# Altium schematic symbol library Analog Devices Data Converters Digital-to-Analog Converters.SchLib: 2231 symbols (part 90 of 135)
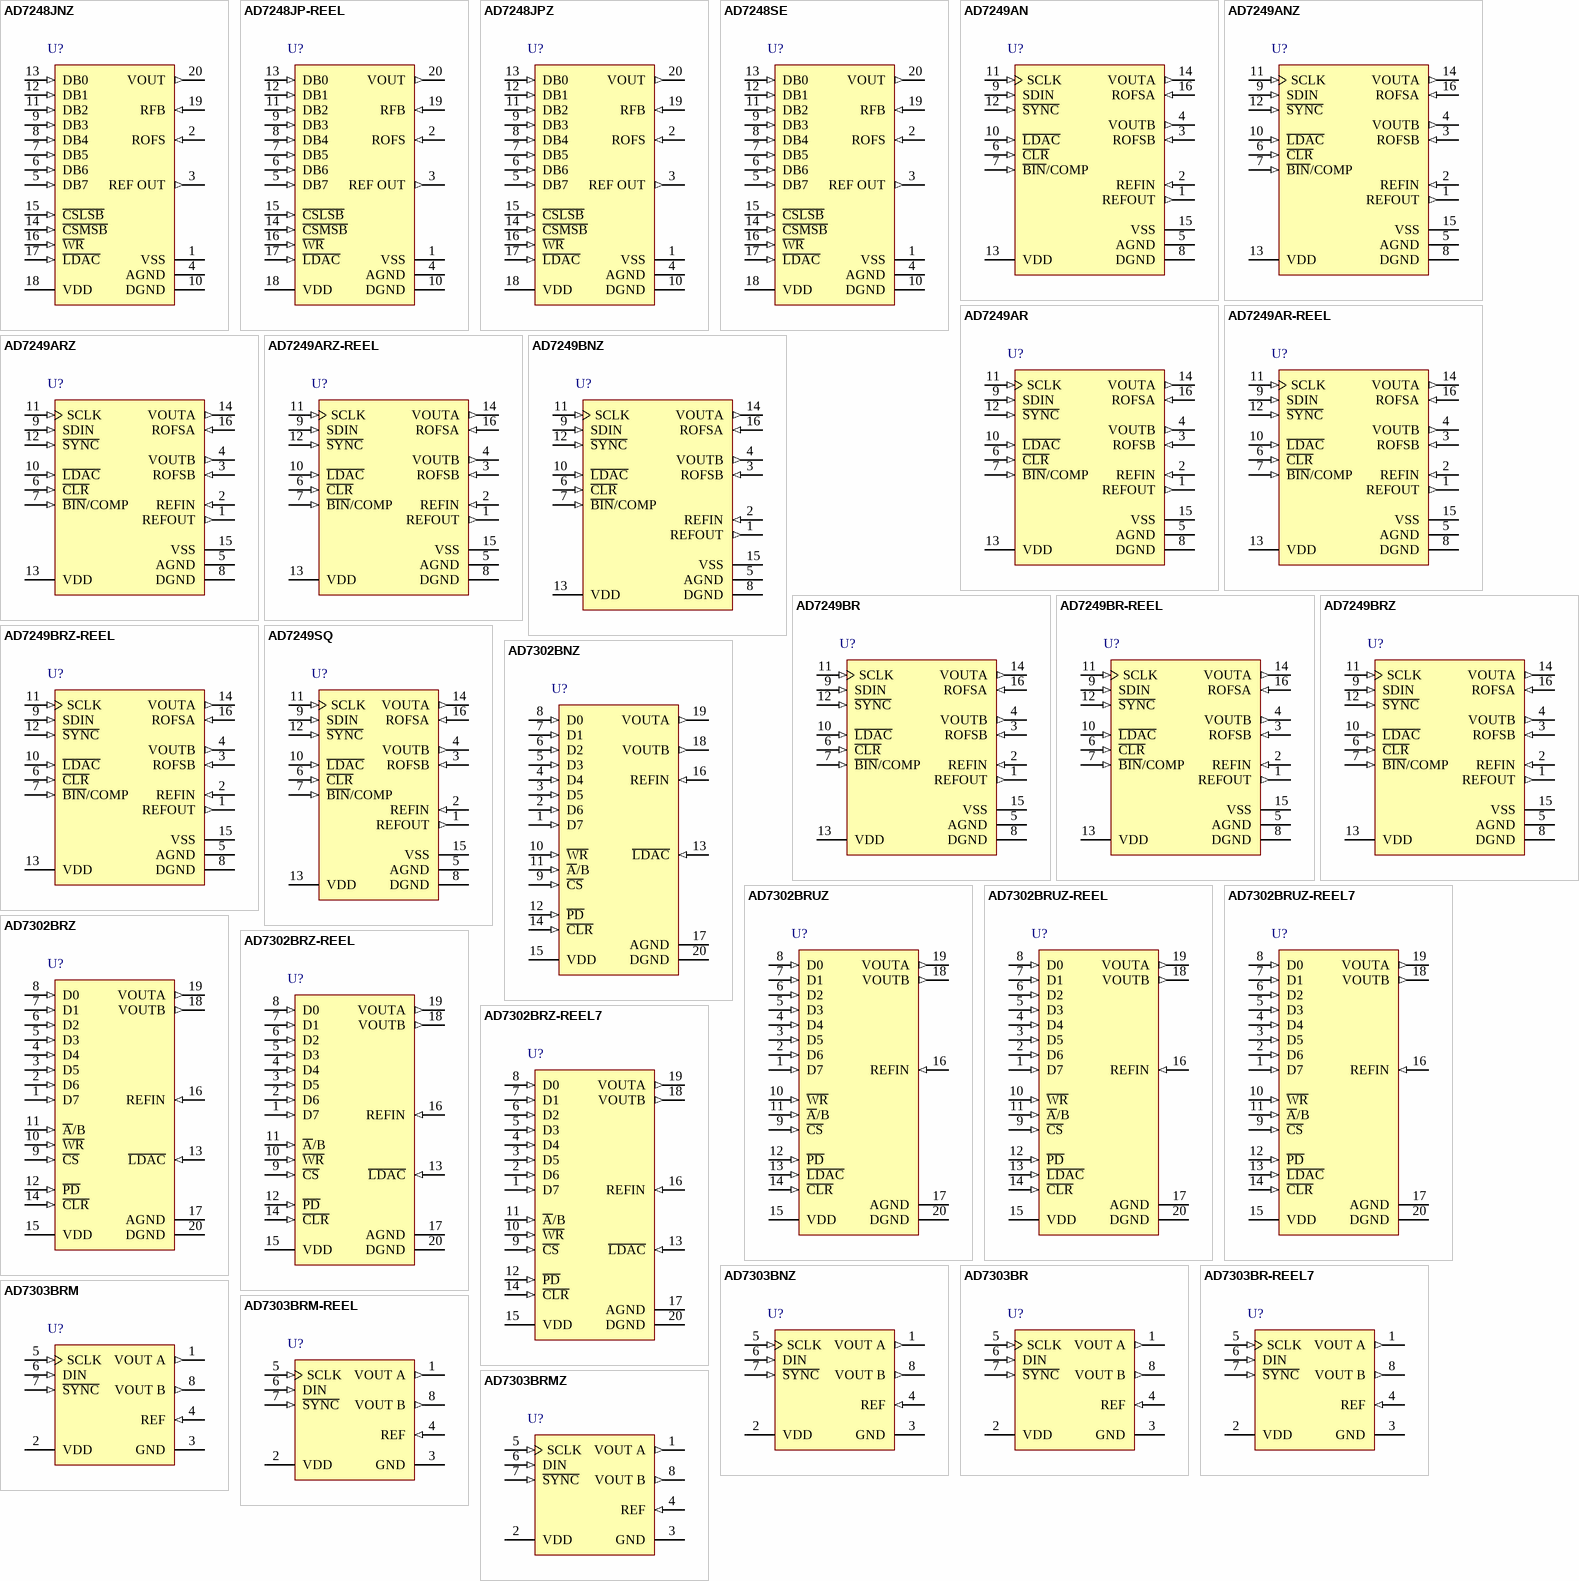
[diagram p202: symbols AD7248JNZ to AD7303BRMZ]

## AD7302BRZ-REEL
designator U?
Dual 8-Bit Voltage Output Digital-to-Analog Converter with Parallel Interface, 2.7 to 5.5 V, 0 to 70 degC, RW-20, Pb-Free, Reel; Generic Part Number: AD7302; Manufacturer: Analog Devices; PartNumber: AD7302BRZ-REEL; # DAC Outputs: 2; Max V+: 5.5V; Op Pwr Diss: 24.8mW; Resolution (Bits): 8; Settling Time: 1.2µs; Single Supply: Yes; DatasheetVersion: Rev.0; PackageVersion: 060706-A; PackageReference: RW-20; PackageDescription: 20-Lead Standard Small Outline Package [SOIC_W] Wide Body; Supplier 1: Digi-Key; Supplier Part Number 1: AD7302BRZ-REEL-ND; Supplier 2: Mouser; Supplier Part Number 2: 584-AD7302BRZ-R; Packing: Reel; RoHS: Y; Mounting Technology: Surface Mount; Code_JEDEC: MS-013-AC; ComponentLink1Description: Manufacturer URL; ComponentLink1URL: http://www.analog.com/en/index.html; ComponentLink2Description: Datasheet; ComponentLink2URL: http://www.analog.com/static/imported-files/data_sheets/AD7302.pdf; ComponentLink3Description: Package Specification; ComponentLink3URL: http://www.analog.com/static/imported-files/packages/233848RW_20.pdf; ComponentLink4Description: Product URL; ComponentLink4URL: http://www.analog.com/en/digital-to-analog-converters/da-converters/ad7302/products/product.html
footprint RW-20_N (SOIC, 20-Leads, Body 12.8x7.5mm, Pitch 1.27mm, IPC Medium Density)
footprint RW-20_L (SOIC, 20-Leads, Body 12.8x7.5mm, Pitch 1.27mm, IPC High Density)
footprint RW-20_M (SOIC, 20-Leads, Body 12.8x7.5mm, Pitch 1.27mm, IPC Low Density)
pins: 1 D7 (in) "Parallel Data Inputs. Eight-bit data is loaded to the input register of the AD7302 under the control of C\S\ and W\R\.", 2 D6 (in) "Parallel Data Inputs. Eight-bit data is loaded to the input register of the AD7302 under the control of C\S\ and W\R\.", 3 D5 (in) "Parallel Data Inputs. Eight-bit data is loaded to the input register of the AD7302 under the control of C\S\ and W\R\.", 4 D4 (in) "Parallel Data Inputs. Eight-bit data is loaded to the input register of the AD7302 under the control of C\S\ and W\R\.", 5 D3 (in) "Parallel Data Inputs. Eight-bit data is loaded to the input register of the AD7302 under the control of C\S\ and W\R\.", 6 D2 (in) "Parallel Data Inputs. Eight-bit data is loaded to the input register of the AD7302 under the control of C\S\ and W\R\.", 7 D1 (in) "Parallel Data Inputs. Eight-bit data is loaded to the input register of the AD7302 under the control of C\S\ and W\R\.", 8 D0 (in) "Parallel Data Inputs. Eight-bit data is loaded to the input register of the AD7302 under the control of C\S\ and W\R\.", 9 ~{CS} (in) "Chip Select. Active low logic input.", 10 ~{WR} (in) "Write Input. W\R\ is an active low logic input used in conjunction with C\S\ and A\/B to write data to the selected DAC register.", 11 ~{A}/B (in) "DAC Select. Address pin used to select writing to either DAC A or DAC B.", 12 ~{PD} (in) "Active low input used to put the part into low power mode reducing current consumption to less than 1 µA.", 13 ~{LDAC} (in) "Load DAC Logic Input. When this logic input is taken low both DAC outputs are simultaneously updated with the contents of their DAC registers. If L\D\A\C\ is permanently tied low, the DACs are updated on the rising edge of (See Datasheet)", 14 ~{CLR} (in) "Asynchronous Clear Input (Active Low). When this input is taken low the DAC registers are loaded with all zeroes and the DAC outputs are cleared to zero volts.", 15 VDD (power) "Power Supply Input. These parts can be operated from 2.7 V to 5.5 V and should be decoupled to AGND.", 16 REFIN (in) "External Reference Input. This can used as the reference for both DACs. The range on this reference input is 1 V to VDD/2. If REFIN is directly tied to VDD the internal VDD/2 reference is selected.", 17 AGND (power) "Analog Ground reference point and return point for all analog current on the part.", 18 VOUTB (out) "Analog output voltage from DAC B. The output amplifier can swing rail to rail on its output.", 19 VOUTA (out) "Analog output voltage from DAC A. The output amplifier can swing rail to rail on its output.", 20 DGND (power) "Digital Ground reference point and return point for all digital current on the part."

## AD7302BRZ-REEL7
designator U?
Dual 8-Bit Voltage Output Digital-to-Analog Converter with Parallel Interface, 2.7 to 5.5 V, 0 to 70 degC, RW-20, Pb-Free, Reel; Generic Part Number: AD7302; Manufacturer: Analog Devices; PartNumber: AD7302BRZ-REEL7; # DAC Outputs: 2; Max V+: 5.5V; Op Pwr Diss: 24.8mW; Resolution (Bits): 8; Settling Time: 1.2µs; Single Supply: Yes; DatasheetVersion: Rev.0; PackageVersion: 060706-A; PackageReference: RW-20; PackageDescription: 20-Lead Standard Small Outline Package [SOIC_W] Wide Body; Supplier 1: Digi-Key; Supplier Part Number 1: AD7302BRZ-REEL7TR-ND; Supplier 2: Digi-Key; Supplier Part Number 2: AD7302BRZ-REEL7CT-ND; Supplier 3: Digi-Key; Supplier Part Number 3: AD7302BRZ-REEL7DKR-ND; Supplier 4: Mouser; Supplier Part Number 4: 584-AD7302BRZ-R7; Packing: Reel; RoHS: Y; Mounting Technology: Surface Mount; Code_JEDEC: MS-013-AC; ComponentLink1Description: Manufacturer URL; ComponentLink1URL: http://www.analog.com/en/index.html; ComponentLink2Description: Datasheet; ComponentLink2URL: http://www.analog.com/static/imported-files/data_sheets/AD7302.pdf; ComponentLink3Description: Package Specification; ComponentLink3URL: http://www.analog.com/static/imported-files/packages/233848RW_20.pdf; ComponentLink4Description: Product URL; ComponentLink4URL: http://www.analog.com/en/digital-to-analog-converters/da-converters/ad7302/products/product.html
footprint RW-20_N (SOIC, 20-Leads, Body 12.8x7.5mm, Pitch 1.27mm, IPC Medium Density)
footprint RW-20_L (SOIC, 20-Leads, Body 12.8x7.5mm, Pitch 1.27mm, IPC High Density)
footprint RW-20_M (SOIC, 20-Leads, Body 12.8x7.5mm, Pitch 1.27mm, IPC Low Density)
pins: 1 D7 (in) "Parallel Data Inputs. Eight-bit data is loaded to the input register of the AD7302 under the control of C\S\ and W\R\.", 2 D6 (in) "Parallel Data Inputs. Eight-bit data is loaded to the input register of the AD7302 under the control of C\S\ and W\R\.", 3 D5 (in) "Parallel Data Inputs. Eight-bit data is loaded to the input register of the AD7302 under the control of C\S\ and W\R\.", 4 D4 (in) "Parallel Data Inputs. Eight-bit data is loaded to the input register of the AD7302 under the control of C\S\ and W\R\.", 5 D3 (in) "Parallel Data Inputs. Eight-bit data is loaded to the input register of the AD7302 under the control of C\S\ and W\R\.", 6 D2 (in) "Parallel Data Inputs. Eight-bit data is loaded to the input register of the AD7302 under the control of C\S\ and W\R\.", 7 D1 (in) "Parallel Data Inputs. Eight-bit data is loaded to the input register of the AD7302 under the control of C\S\ and W\R\.", 8 D0 (in) "Parallel Data Inputs. Eight-bit data is loaded to the input register of the AD7302 under the control of C\S\ and W\R\.", 9 ~{CS} (in) "Chip Select. Active low logic input.", 10 ~{WR} (in) "Write Input. W\R\ is an active low logic input used in conjunction with C\S\ and A\/B to write data to the selected DAC register.", 11 ~{A}/B (in) "DAC Select. Address pin used to select writing to either DAC A or DAC B.", 12 ~{PD} (in) "Active low input used to put the part into low power mode reducing current consumption to less than 1 µA.", 13 ~{LDAC} (in) "Load DAC Logic Input. When this logic input is taken low both DAC outputs are simultaneously updated with the contents of their DAC registers. If L\D\A\C\ is permanently tied low, the DACs are updated on the rising edge of (See Datasheet)", 14 ~{CLR} (in) "Asynchronous Clear Input (Active Low). When this input is taken low the DAC registers are loaded with all zeroes and the DAC outputs are cleared to zero volts.", 15 VDD (power) "Power Supply Input. These parts can be operated from 2.7 V to 5.5 V and should be decoupled to AGND.", 16 REFIN (in) "External Reference Input. This can used as the reference for both DACs. The range on this reference input is 1 V to VDD/2. If REFIN is directly tied to VDD the internal VDD/2 reference is selected.", 17 AGND (power) "Analog Ground reference point and return point for all analog current on the part.", 18 VOUTB (out) "Analog output voltage from DAC B. The output amplifier can swing rail to rail on its output.", 19 VOUTA (out) "Analog output voltage from DAC A. The output amplifier can swing rail to rail on its output.", 20 DGND (power) "Digital Ground reference point and return point for all digital current on the part."

## AD7303BNZ
designator U?
Dual 8-Bit Voltage Output Digital-to-Analog Converter with Serial Interface, 2.7 to 5.5 V, 0 to +70 degC, N-8, Pb-Free, Tube; Generic Part Number: AD7303; Manufacturer: Analog Devices; PartNumber: AD7303BNZ; # DAC Outputs: 2; Max V+: 5.5V; Op Pwr Diss: 6.93mW; Resolution (Bits): 8; Settling Time: 1.2µs; Single Supply: Yes; DatasheetVersion: Rev.0; PackageVersion: 070606-A; PackageReference: N-8; PackageDescription: 8-Lead Plastic Dual In-Line Package [PDIP] Narrow Body; Supplier 1: Digi-Key; Supplier Part Number 1: AD7303BNZ-ND; Supplier 2: Farnell; Supplier Part Number 2: 1079413; Supplier 3: Newark; Supplier Part Number 3: 31M4235; Supplier 4: Newark; Supplier Part Number 4: 19M0854; Supplier 5: Mouser; Supplier Part Number 5: 584-AD7303BNZ; Packing: Tube; RoHS: Y; Mounting Technology: Through Hole; Code_JEDEC: MS-001; ComponentLink1Description: Manufacturer URL; ComponentLink1URL: http://www.analog.com/en/index.html; ComponentLink2Description: Datasheet; ComponentLink2URL: http://www.analog.com/static/imported-files/data_sheets/AD7303.pdf; ComponentLink3Description: Package Specification; ComponentLink3URL: http://www.analog.com/static/imported-files/packages/PKG_PDF/PDIP(N)/N_8.pdf; ComponentLink4Description: Product URL; ComponentLink4URL: http://www.analog.com/en/digital-to-analog-converters/da-converters/ad7303/products/product.html
footprint N-8 (DIP, 8-Leads, Row Spacing 7.62mm, Pitch 2.54mm, Body 9.6x6.6mm)
pins: 1 VOUT A (out) "Analog Output Voltage from DAC A. The output amplifier swings rail to rail on its output.", 2 VDD (power) "Power Supply Input. These parts can be operated from +2.7 V to +5.5 V and should be decoupled to GND.", 3 GND (power) "Ground reference point for all circuitry on the part.", 4 REF (in) "External Reference Input. This can be used as the reference for both DACs, and is selected by setting the I\N\T\/EXT bit in the control register to a logic one. The range on this reference input is 1 V to VDD/2. When the (See Datasheet)", 5 SCLK (in) "Serial Clock. Logic Input. Data is clocked into the input shift register on the rising edge of the serial clock input. Data can be transferred at rates up to 30 MHz.", 6 DIN (in) "Serial Data Input. This device has a 16-bit shift register, 8 bits for data and 8 bits for control. Data is clocked into the register on the rising edge of the clock input.", 7 ~{SYNC} (in) "Level Triggered Control Input (active low). This is the frame synchronization signal for the input data. When S\Y\N\C\ goes low, it enables the input shift register and data is transferred in on the rising edges of the (See Datasheet)", 8 VOUT B (out) "Analog output voltage from DAC B. The output amplifier swings rail to rail on its output."

## AD7303BR
designator U?
Dual 8-Bit Voltage Output Digital-to-Analog Converter with Serial Interface, 2.7 to 5.5 V, 0 to +70 degC, R-8, Tube; Generic Part Number: AD7303; Manufacturer: Analog Devices; PartNumber: AD7303BR; # DAC Outputs: 2; Max V+: 5.5V; Op Pwr Diss: 6.93mW; Resolution (Bits): 8; Settling Time: 1.2µs; Single Supply: Yes; DatasheetVersion: Rev.0; PackageVersion: 060506-A; PackageReference: R-8; PackageDescription: 8-Lead Standard Small Outline Package [SOIC_N] Narrow Body; Supplier 1: Digi-Key; Supplier Part Number 1: AD7303BR-ND; Supplier 2: Mouser; Supplier Part Number 2: 584-AD7303BR; Packing: Tube; RoHS: N; Mounting Technology: Surface Mount; Code_JEDEC: MS-012-AA; Code_IPC: SOIC127P600-8; ComponentLink1Description: Manufacturer URL; ComponentLink1URL: http://www.analog.com/en/index.html; ComponentLink2Description: Datasheet; ComponentLink2URL: http://www.analog.com/static/imported-files/data_sheets/AD7303.pdf; ComponentLink3Description: Package Specification; ComponentLink3URL: http://www.analog.com/static/imported-files/packages/PKG_PDF/SOIC_Narrow%20(R)/R_8.pdf; ComponentLink4Description: Product URL; ComponentLink4URL: http://www.analog.com/en/digital-to-analog-converters/da-converters/ad7303/products/product.html
footprint R-8_N (SOIC, 8-Leads, Body 4.9x3.9mm, Pitch 1.27mm, IPC Medium Density)
footprint R-8_L (SOIC, 8-Leads, Body 4.9x3.9mm, Pitch 1.27mm, IPC High Density)
footprint R-8_M (SOIC, 8-Leads, Body 4.9x3.9mm, Pitch 1.27mm, IPC Low Density)
pins: 1 VOUT A (out) "Analog Output Voltage from DAC A. The output amplifier swings rail to rail on its output.", 2 VDD (power) "Power Supply Input. These parts can be operated from +2.7 V to +5.5 V and should be decoupled to GND.", 3 GND (power) "Ground reference point for all circuitry on the part.", 4 REF (in) "External Reference Input. This can be used as the reference for both DACs, and is selected by setting the I\N\T\/EXT bit in the control register to a logic one. The range on this reference input is 1 V to VDD/2. When the (See Datasheet)", 5 SCLK (in) "Serial Clock. Logic Input. Data is clocked into the input shift register on the rising edge of the serial clock input. Data can be transferred at rates up to 30 MHz.", 6 DIN (in) "Serial Data Input. This device has a 16-bit shift register, 8 bits for data and 8 bits for control. Data is clocked into the register on the rising edge of the clock input.", 7 ~{SYNC} (in) "Level Triggered Control Input (active low). This is the frame synchronization signal for the input data. When S\Y\N\C\ goes low, it enables the input shift register and data is transferred in on the rising edges of the (See Datasheet)", 8 VOUT B (out) "Analog output voltage from DAC B. The output amplifier swings rail to rail on its output."

## AD7303BR-REEL7
designator U?
Dual 8-Bit Voltage Output Digital-to-Analog Converter with Serial Interface, 2.7 to 5.5 V, 0 to +70 degC, R-8, Reel; Generic Part Number: AD7303; Manufacturer: Analog Devices; PartNumber: AD7303BR-REEL7; # DAC Outputs: 2; Max V+: 5.5V; Op Pwr Diss: 6.93mW; Resolution (Bits): 8; Settling Time: 1.2µs; Single Supply: Yes; DatasheetVersion: Rev.0; PackageVersion: 060506-A; PackageReference: R-8; PackageDescription: 8-Lead Standard Small Outline Package [SOIC_N] Narrow Body; Supplier 1: Digi-Key; Supplier Part Number 1: AD7303BR-REEL7-ND; Supplier 2: Mouser; Supplier Part Number 2: 584-AD7303BR-R7; Packing: Reel; RoHS: N; Mounting Technology: Surface Mount; Code_JEDEC: MS-012-AA; Code_IPC: SOIC127P600-8; ComponentLink1Description: Manufacturer URL; ComponentLink1URL: http://www.analog.com/en/index.html; ComponentLink2Description: Datasheet; ComponentLink2URL: http://www.analog.com/static/imported-files/data_sheets/AD7303.pdf; ComponentLink3Description: Package Specification; ComponentLink3URL: http://www.analog.com/static/imported-files/packages/PKG_PDF/SOIC_Narrow%20(R)/R_8.pdf; ComponentLink4Description: Product URL; ComponentLink4URL: http://www.analog.com/en/digital-to-analog-converters/da-converters/ad7303/products/product.html
footprint R-8_N (SOIC, 8-Leads, Body 4.9x3.9mm, Pitch 1.27mm, IPC Medium Density)
footprint R-8_L (SOIC, 8-Leads, Body 4.9x3.9mm, Pitch 1.27mm, IPC High Density)
footprint R-8_M (SOIC, 8-Leads, Body 4.9x3.9mm, Pitch 1.27mm, IPC Low Density)
pins: 1 VOUT A (out) "Analog Output Voltage from DAC A. The output amplifier swings rail to rail on its output.", 2 VDD (power) "Power Supply Input. These parts can be operated from +2.7 V to +5.5 V and should be decoupled to GND.", 3 GND (power) "Ground reference point for all circuitry on the part.", 4 REF (in) "External Reference Input. This can be used as the reference for both DACs, and is selected by setting the I\N\T\/EXT bit in the control register to a logic one. The range on this reference input is 1 V to VDD/2. When the (See Datasheet)", 5 SCLK (in) "Serial Clock. Logic Input. Data is clocked into the input shift register on the rising edge of the serial clock input. Data can be transferred at rates up to 30 MHz.", 6 DIN (in) "Serial Data Input. This device has a 16-bit shift register, 8 bits for data and 8 bits for control. Data is clocked into the register on the rising edge of the clock input.", 7 ~{SYNC} (in) "Level Triggered Control Input (active low). This is the frame synchronization signal for the input data. When S\Y\N\C\ goes low, it enables the input shift register and data is transferred in on the rising edges of the (See Datasheet)", 8 VOUT B (out) "Analog output voltage from DAC B. The output amplifier swings rail to rail on its output."

## AD7303BRM
designator U?
Dual 8-Bit Voltage Output Digital-to-Analog Converter with Serial Interface, 2.7 to 5.5 V, -40 to +105 degC, RM-8, Tube; Generic Part Number: AD7303; Manufacturer: Analog Devices; PartNumber: AD7303BRM; # DAC Outputs: 2; Max V+: 5.5V; Op Pwr Diss: 6.93mW; Resolution (Bits): 8; Settling Time: 1.2µs; Single Supply: Yes; DatasheetVersion: Rev.0; PackageVersion: Aug-2005; PackageReference: RM-8; PackageDescription: 8-Lead Mini Small Outline Package [MSOP]; Supplier 1: Digi-Key; Supplier Part Number 1: AD7303BRM-ND; Supplier 2: Mouser; Supplier Part Number 2: 584-AD7303BRM; Packing: Tube; RoHS: N; Mounting Technology: Surface Mount; Code_JEDEC: MO-187-AA; ComponentLink1Description: Manufacturer URL; ComponentLink1URL: http://www.analog.com/en/index.html; ComponentLink2Description: Datasheet; ComponentLink2URL: http://www.analog.com/static/imported-files/data_sheets/AD7303.pdf; ComponentLink3Description: Package Specification; ComponentLink3URL: http://www.analog.com/static/imported-files/packages/PKG_PDF/MSOP%28RM%29/RM_8.pdf; ComponentLink4Description: Product URL; ComponentLink4URL: http://www.analog.com/en/digital-to-analog-converters/da-converters/ad7303/products/product.html
footprint RM-8_N (TSOP, 8-Leads, Body 3x3mm, Pitch 0.65mm, IPC Medium Density)
footprint RM-8_L (TSOP, 8-Leads, Body 3x3mm, Pitch 0.65mm, IPC High Density)
footprint RM-8_M (TSOP, 8-Leads, Body 3x3mm, Pitch 0.65mm, IPC Low Density)
pins: 1 VOUT A (out) "Analog Output Voltage from DAC A. The output amplifier swings rail to rail on its output.", 2 VDD (power) "Power Supply Input. These parts can be operated from +2.7 V to +5.5 V and should be decoupled to GND.", 3 GND (power) "Ground reference point for all circuitry on the part.", 4 REF (in) "External Reference Input. This can be used as the reference for both DACs, and is selected by setting the I\N\T\/EXT bit in the control register to a logic one. The range on this reference input is 1 V to VDD/2. When the (See Datasheet)", 5 SCLK (in) "Serial Clock. Logic Input. Data is clocked into the input shift register on the rising edge of the serial clock input. Data can be transferred at rates up to 30 MHz.", 6 DIN (in) "Serial Data Input. This device has a 16-bit shift register, 8 bits for data and 8 bits for control. Data is clocked into the register on the rising edge of the clock input.", 7 ~{SYNC} (in) "Level Triggered Control Input (active low). This is the frame synchronization signal for the input data. When S\Y\N\C\ goes low, it enables the input shift register and data is transferred in on the rising edges of the (See Datasheet)", 8 VOUT B (out) "Analog output voltage from DAC B. The output amplifier swings rail to rail on its output."

## AD7303BRM-REEL
designator U?
Dual 8-Bit Voltage Output Digital-to-Analog Converter with Serial Interface, 2.7 to 5.5 V, -40 to +105 degC, RM-8, Reel; Generic Part Number: AD7303; Manufacturer: Analog Devices; PartNumber: AD7303BRM-REEL; # DAC Outputs: 2; Max V+: 5.5V; Op Pwr Diss: 6.93mW; Resolution (Bits): 8; Settling Time: 1.2µs; Single Supply: Yes; DatasheetVersion: Rev.0; PackageVersion: Aug-2005; PackageReference: RM-8; PackageDescription: 8-Lead Mini Small Outline Package [MSOP]; Supplier 1: Mouser; Supplier Part Number 1: N/A; Packing: Reel; RoHS: N; Mounting Technology: Surface Mount; Code_JEDEC: MO-187-AA; ComponentLink1Description: Manufacturer URL; ComponentLink1URL: http://www.analog.com/en/index.html; ComponentLink2Description: Datasheet; ComponentLink2URL: http://www.analog.com/static/imported-files/data_sheets/AD7303.pdf; ComponentLink3Description: Package Specification; ComponentLink3URL: http://www.analog.com/static/imported-files/packages/PKG_PDF/MSOP%28RM%29/RM_8.pdf; ComponentLink4Description: Product URL; ComponentLink4URL: http://www.analog.com/en/digital-to-analog-converters/da-converters/ad7303/products/product.html
footprint RM-8_N (TSOP, 8-Leads, Body 3x3mm, Pitch 0.65mm, IPC Medium Density)
footprint RM-8_L (TSOP, 8-Leads, Body 3x3mm, Pitch 0.65mm, IPC High Density)
footprint RM-8_M (TSOP, 8-Leads, Body 3x3mm, Pitch 0.65mm, IPC Low Density)
pins: 1 VOUT A (out) "Analog Output Voltage from DAC A. The output amplifier swings rail to rail on its output.", 2 VDD (power) "Power Supply Input. These parts can be operated from +2.7 V to +5.5 V and should be decoupled to GND.", 3 GND (power) "Ground reference point for all circuitry on the part.", 4 REF (in) "External Reference Input. This can be used as the reference for both DACs, and is selected by setting the I\N\T\/EXT bit in the control register to a logic one. The range on this reference input is 1 V to VDD/2. When the (See Datasheet)", 5 SCLK (in) "Serial Clock. Logic Input. Data is clocked into the input shift register on the rising edge of the serial clock input. Data can be transferred at rates up to 30 MHz.", 6 DIN (in) "Serial Data Input. This device has a 16-bit shift register, 8 bits for data and 8 bits for control. Data is clocked into the register on the rising edge of the clock input.", 7 ~{SYNC} (in) "Level Triggered Control Input (active low). This is the frame synchronization signal for the input data. When S\Y\N\C\ goes low, it enables the input shift register and data is transferred in on the rising edges of the (See Datasheet)", 8 VOUT B (out) "Analog output voltage from DAC B. The output amplifier swings rail to rail on its output."

## AD7303BRMZ
designator U?
Dual 8-Bit Voltage Output Digital-to-Analog Converter with Serial Interface, 2.7 to 5.5 V, -40 to +105 degC, RM-8, Pb-Free, Tube; Generic Part Number: AD7303; Manufacturer: Analog Devices; PartNumber: AD7303BRMZ; # DAC Outputs: 2; Max V+: 5.5V; Op Pwr Diss: 6.93mW; Resolution (Bits): 8; Settling Time: 1.2µs; Single Supply: Yes; DatasheetVersion: Rev.0; PackageVersion: Aug-2005; PackageReference: RM-8; PackageDescription: 8-Lead Mini Small Outline Package [MSOP]; Supplier 1: Digi-Key; Supplier Part Number 1: AD7303BRMZ-ND; Supplier 2: Newark; Supplier Part Number 2: 59K4694; Supplier 3: Mouser; Supplier Part Number 3: 584-AD7303BRMZ; Packing: Tube; RoHS: Y; Mounting Technology: Surface Mount; Code_JEDEC: MO-187-AA; ComponentLink1Description: Manufacturer URL; ComponentLink1URL: http://www.analog.com/en/index.html; ComponentLink2Description: Datasheet; ComponentLink2URL: http://www.analog.com/static/imported-files/data_sheets/AD7303.pdf; ComponentLink3Description: Package Specification; ComponentLink3URL: http://www.analog.com/static/imported-files/packages/PKG_PDF/MSOP%28RM%29/RM_8.pdf; ComponentLink4Description: Product URL; ComponentLink4URL: http://www.analog.com/en/digital-to-analog-converters/da-converters/ad7303/products/product.html
footprint RM-8_N (TSOP, 8-Leads, Body 3x3mm, Pitch 0.65mm, IPC Medium Density)
footprint RM-8_L (TSOP, 8-Leads, Body 3x3mm, Pitch 0.65mm, IPC High Density)
footprint RM-8_M (TSOP, 8-Leads, Body 3x3mm, Pitch 0.65mm, IPC Low Density)
pins: 1 VOUT A (out) "Analog Output Voltage from DAC A. The output amplifier swings rail to rail on its output.", 2 VDD (power) "Power Supply Input. These parts can be operated from +2.7 V to +5.5 V and should be decoupled to GND.", 3 GND (power) "Ground reference point for all circuitry on the part.", 4 REF (in) "External Reference Input. This can be used as the reference for both DACs, and is selected by setting the I\N\T\/EXT bit in the control register to a logic one. The range on this reference input is 1 V to VDD/2. When the (See Datasheet)", 5 SCLK (in) "Serial Clock. Logic Input. Data is clocked into the input shift register on the rising edge of the serial clock input. Data can be transferred at rates up to 30 MHz.", 6 DIN (in) "Serial Data Input. This device has a 16-bit shift register, 8 bits for data and 8 bits for control. Data is clocked into the register on the rising edge of the clock input.", 7 ~{SYNC} (in) "Level Triggered Control Input (active low). This is the frame synchronization signal for the input data. When S\Y\N\C\ goes low, it enables the input shift register and data is transferred in on the rising edges of the (See Datasheet)", 8 VOUT B (out) "Analog output voltage from DAC B. The output amplifier swings rail to rail on its output."

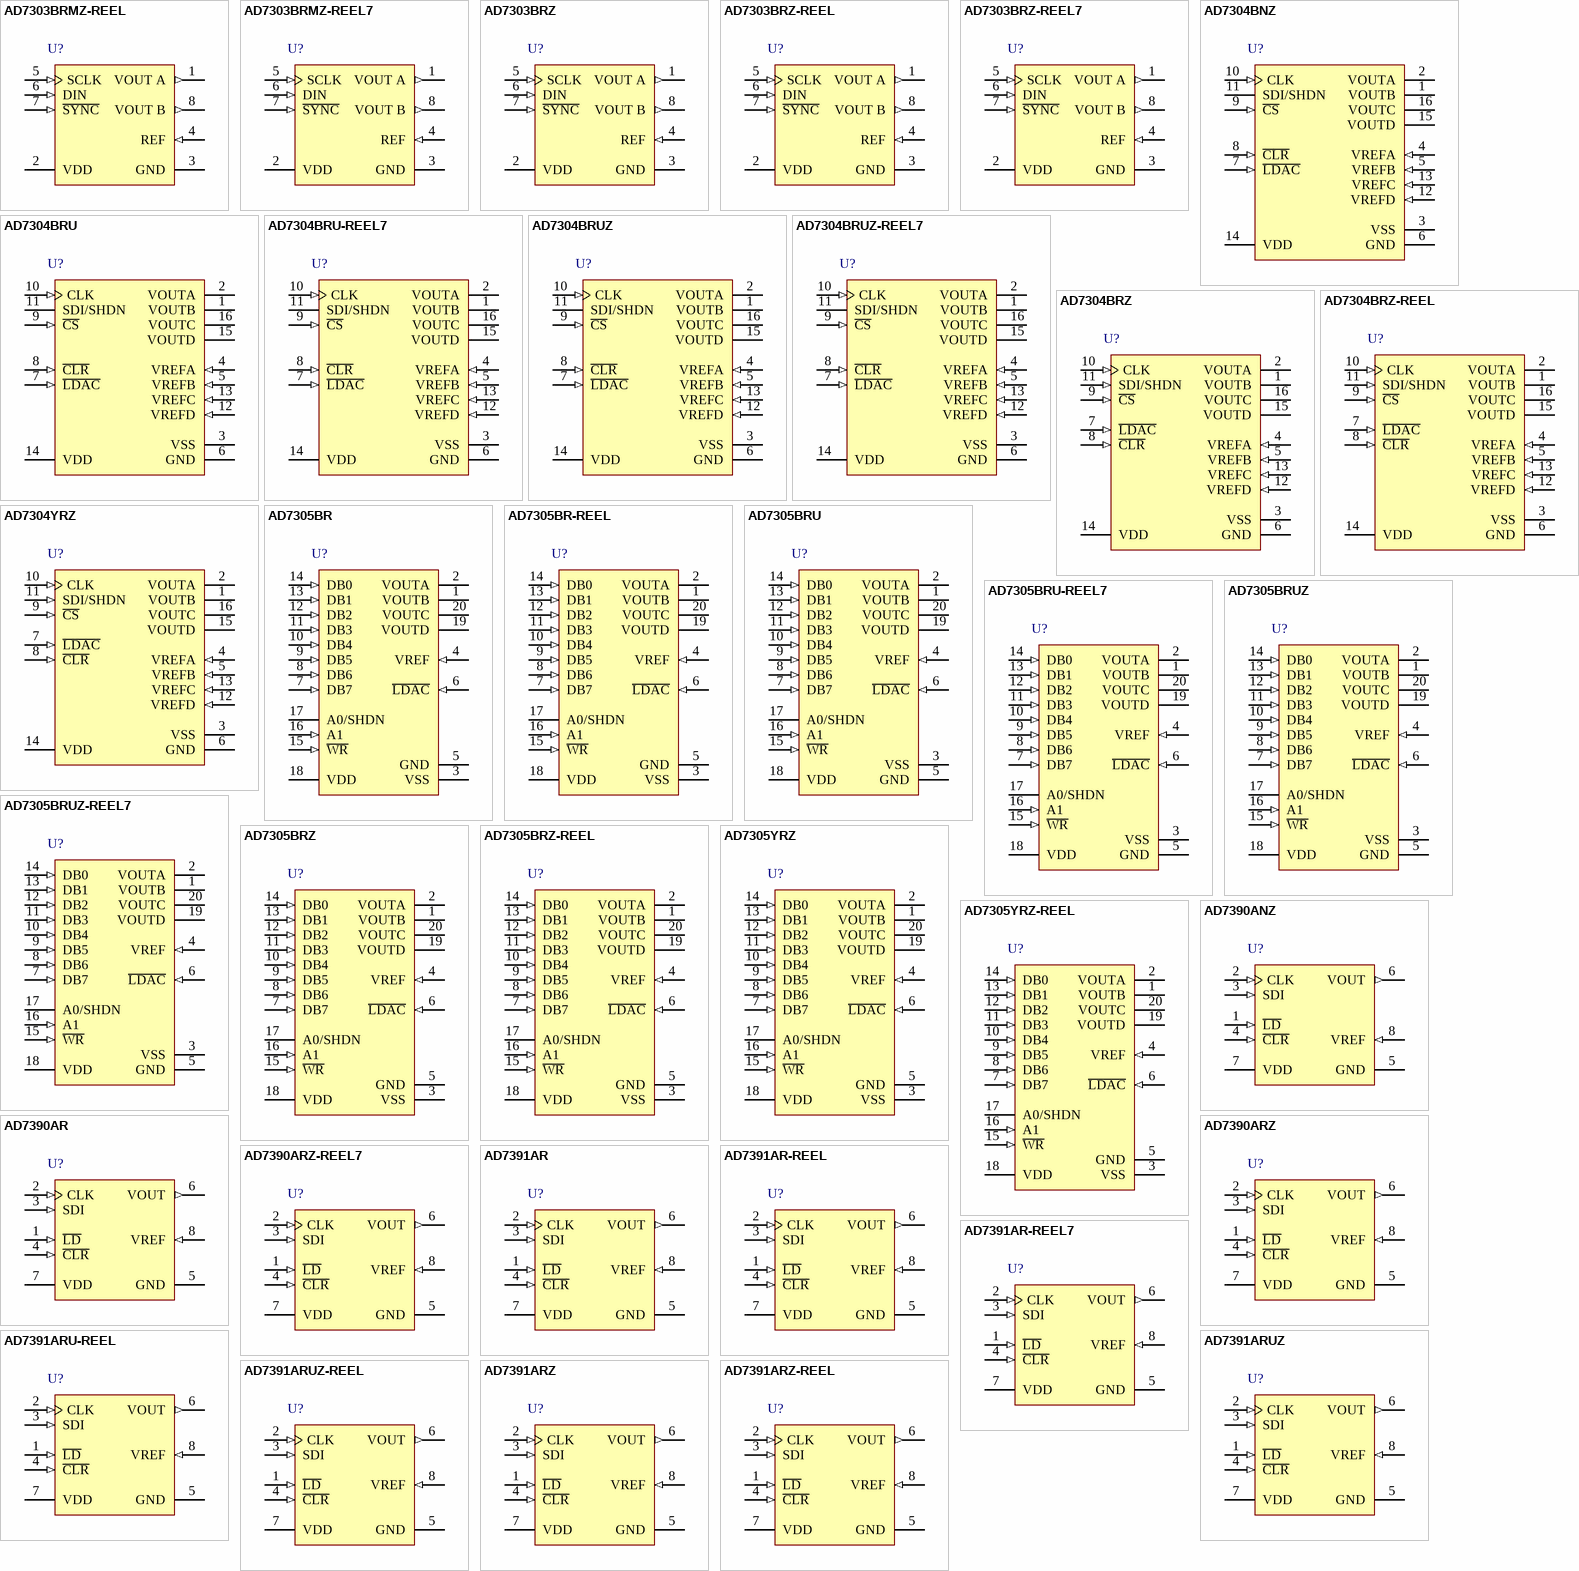
[diagram p64: symbols AD7303BRMZ-REEL to AD7391ARZ-REEL]
